# Altium footprint library mastermind.PCBLIB: 1061 footprints (part 60 of 67)
Each footprint in its own frame and in the unit in brackets; x right, y up, seen from the top. Pads: shape width x height; smd on the part's side, far side on the other; paste and mask are expansions set on the pad; w line width, h text height; cw(c..) or ccw(c..) is an arc to the next point about the centre after c.
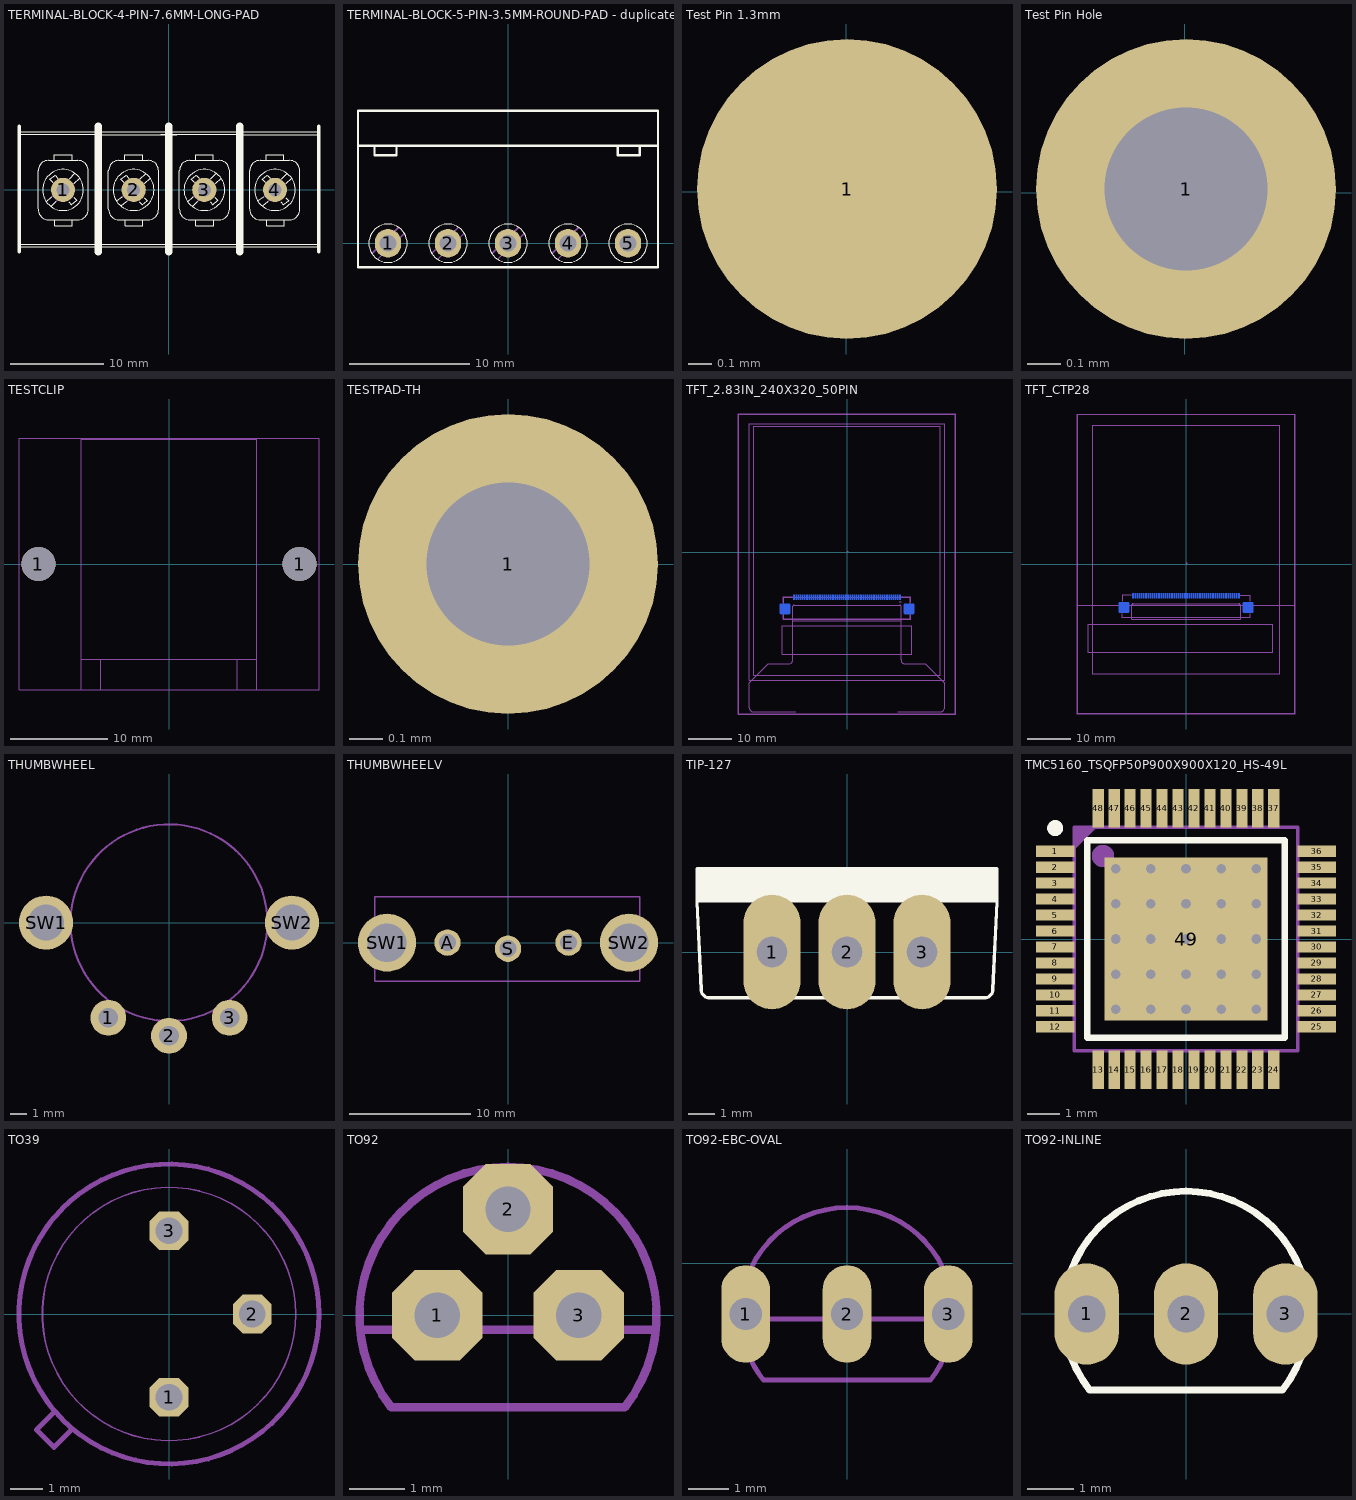
[diagram p59: the footprints below, top view; thin cyan lines are the x and y axes]

## TERMINAL-BLOCK-4-PIN-7.6MM-LONG-PAD [mm]
pads (4):
  round 2.6 / inner round 1.524 / far side round 1.7 hole 1.4: 1(-11.4,0) 2(-3.8,0) 3(3.8,0) 4(11.4,0)
Top Overlay:
  circle w0.102: c3.803,0.002 r2.2
  circle w0.102: c11.397,0.002 r2.2
  circle w0.102: c-3.803,0.001 r2.2
  circle w0.102: c-11.397,0.001 r2.2
  lines w0.102: -16.134,-6.123 -7.702,-6.123 ; -16.109,5.967 -7.676,5.967 ; -16.007,6.272 -7.575,6.272 ; -15.982,-5.844 -7.549,-5.844 0.884,-5.844 ; -14.077,-2.084 ccw(c-12.959,-2.084) -12.959,-3.202 ; -14.077,-2.034 -14.077,2.056 cw(c-12.959,2.056) -12.959,3.173 -9.81,3.173 cw(c-9.81,2.056) -8.692,2.056 -8.692,-2.084 cw(c-9.81,-2.084) -9.81,-3.202 -12.909,-3.202 ; -13.185,-1.249 -12.604,-0.713 ; -12.655,-1.754 -12.121,-1.221 ; -12.489,0.824 -12.807,1.141 -12.25,1.597 -11.967,1.266 ; -12.324,3.173 -12.324,3.808 -11.816,3.808 -10.419,3.808 -10.419,3.173 ; -12.299,-3.202 -12.299,-3.837 -11.791,-3.837 -10.394,-3.837 -10.394,-3.202 ; -10.775,-1.246 -10.492,-1.577 -9.935,-1.121 -10.253,-0.804 ; -10.699,1.218 -10.139,1.8 ; -10.191,0.71 -9.596,1.259 ; -7.625,5.942 0.807,5.942 ; -7.524,6.272 0.909,6.272 ; -7.498,-6.123 0.934,-6.123 ; -6.508,-2.084 ccw(c-5.39,-2.084) -5.39,-3.202 ; -6.508,-2.034 -6.508,2.056 cw(c-5.39,2.056) -5.39,3.173 -2.241,3.173 cw(c-2.241,2.056) -1.123,2.056 -1.123,-2.084 cw(c-2.241,-2.084) -2.241,-3.202 -5.339,-3.202 ; -5.644,-1.17 -5.009,-0.713 ; -5.136,-1.703 -4.527,-1.221 ; -4.846,0.826 -5.163,1.144 -4.607,1.599 -4.323,1.268 ; -4.755,3.173 -4.755,3.808 -3.358,3.808 -2.85,3.808 -2.85,3.173 ; -4.704,-3.202 -4.704,-3.837 -3.307,-3.837 -2.799,-3.837 -2.799,-3.202 ; -3.18,-1.272 -2.897,-1.602 -2.34,-1.147 -2.658,-0.829 ; -3.079,1.218 -2.52,1.751 ; -2.596,0.71 -2.012,1.243 ; -0.934,-6.123 7.498,-6.123 ; -0.909,5.968 7.524,5.968 ; -0.807,6.272 7.625,6.272 ; -0.782,-5.843 7.651,-5.843 16.084,-5.843 ; 1.123,-2.084 ccw(c2.241,-2.084) 2.241,-3.202 ; 1.123,-2.033 1.123,2.056 cw(c2.241,2.056) 2.241,3.174 5.39,3.174 cw(c5.39,2.056) 6.508,2.056 6.508,-2.084 cw(c5.39,-2.084) 5.39,-3.202 2.291,-3.202 ; 2.015,-1.249 2.596,-0.713 ; 2.545,-1.754 3.079,-1.221 ; 2.711,0.824 2.393,1.142 2.95,1.597 3.233,1.266 ; 2.876,3.174 2.876,3.809 3.384,3.809 4.781,3.809 4.781,3.174 ; 2.901,-3.202 2.901,-3.837 3.409,-3.837 4.806,-3.837 4.806,-3.202 ; 4.425,-1.246 4.708,-1.577 5.265,-1.121 4.947,-0.804 ; 4.501,1.218 5.061,1.8 ; 5.009,0.71 5.604,1.259 ; 7.575,5.942 16.007,5.942 ; 7.676,6.272 16.109,6.272 ; 7.702,-6.123 16.134,-6.123 ; 8.692,-2.084 ccw(c9.81,-2.084) 9.81,-3.202 ; 8.692,-2.033 8.692,2.056 cw(c9.81,2.056) 9.81,3.174 12.959,3.174 cw(c12.959,2.056) 14.077,2.056 14.077,-2.084 cw(c12.959,-2.084) 12.959,-3.202 9.861,-3.202 ; 9.556,-1.17 10.191,-0.713 ; 10.064,-1.703 10.673,-1.221 ; 10.354,0.826 10.037,1.144 10.593,1.599 10.877,1.269 ; 10.445,3.174 10.445,3.809 11.842,3.809 12.35,3.809 12.35,3.174 ; 10.496,-3.202 10.496,-3.837 11.893,-3.837 12.401,-3.837 12.401,-3.202 ; 12.02,-1.271 12.303,-1.602 12.86,-1.147 12.542,-0.829 ; 12.121,1.218 12.68,1.751 ; 12.604,0.71 13.188,1.243
  lines w0.4: -16.1,-6.65 -16.1,6.85 ; 16.1,-6.65 16.1,6.85
  lines w0.8: -7.609,-6.65 -7.609,6.85 ; -0.018,-6.65 -0.018,6.85 ; 7.591,-6.65 7.591,6.85
Mechanical 8:
  lines w0.102: -12.603,-0.709 -10.687,1.207 ; -12.108,-1.205 -10.197,0.707 ; -5.009,-0.709 -3.092,1.207 ; -4.513,-1.205 -2.603,0.707 ; 2.597,-0.709 4.513,1.208 ; 3.092,-1.204 5.003,0.707 ; 10.191,-0.709 12.108,1.208 ; 10.687,-1.204 12.597,0.707
3D body "Barrier Termianl.STEP": height 14.8, standoff -2.5, extent -0.78,-6.777 15.98,6.933
3D body "Barrier Termianl.STEP": height 14.8, standoff -2.5, extent -15.98,-6.777 0.78,6.933

## TERMINAL-BLOCK-5-PIN-3.5MM-ROUND-PAD - duplicate [mm]
pads (5):
  oval 2.2x2.4 / inner round 1.524 / far side oval 2.2x2.4 hole 1.4: 1(-10,0) 2(-5,0) 3(0,0) 4(5,0) 5(10,0)
Top Overlay:
  circle w0.102: c-10,0 r1.6
  circle w0.102: c5,0 r1.6
  circle w0.102: c0,0 r1.6
  circle w0.102: c-5,0 r1.6
  circle w0.102: c10,0 r1.6
  lines w0.203: -12.482,8.117 12.446,8.106 ; -11.105,8.116 -11.125,8.116 -11.125,7.341 -9.29,7.341 -9.29,8.115 ; 9.153,8.107 9.153,7.332 10.988,7.332 10.988,8.106 ; -12.5,-1.984 -12.5,11.049 12.5,11.049 12.5,-2.01 -12.5,-1.984
Mechanical 8:
  lines w0.127: -11.306,-0.837 -9.096,1.335 ; -10.824,-1.319 -8.614,0.827 ; -6.361,-0.862 -4.151,1.31 ; -5.878,-1.345 -3.668,0.802 ; -1.306,-0.837 0.904,1.335 ; -0.824,-1.319 1.386,0.827 ; 3.694,-0.837 5.904,1.335 ; 4.176,-1.319 6.386,0.827

## Test Pin 1.3mm [mm]
pads (1):
  round 1.3 smd paste+0 mask+0: 1(0.004,0.011)

## Test Pin Hole [mil]
pads (1):
  round 35 hole 19.02: 1(0.14,0.45)

## TESTCLIP [mm]
pads (2):
  round 3.5 hole 3.5: 1(-13.4,0) 1(13.4,0)
Mechanical 2:
  lines w0.127: -9,-12.9 -9,-9.8 ; -9,-12.9 -7,-12.9 ; -9,-12.9 -15.4,-12.9 -15.4,12.9 15.4,12.9 15.4,-12.9 9,-12.9 ; -9,-9.8 -7,-9.8 ; -9,-9.8 -9,12.8 9,12.8 9,-9.8 ; -7,-12.9 7,-12.9 ; -7,-12.9 -7,-9.8 ; -7,-12.9 7,-12.9 ; -7,-9.8 7,-9.8 ; 7,-12.9 7,-9.8 ; 7,-12.9 9,-12.9 ; 7,-9.8 9,-9.8 ; 9,-12.9 9,-9.8

## TESTPAD-TH [mil]
pads (1):
  round 35 hole 19.02: 1(0,0)

## TFT_2.83IN_240X320_50PIN [mm]
pads (52):
  rect 0.275x1.2 smd far side mask-0.6: 1(12.25,-10.39) 2(11.75,-10.39) 3(11.25,-10.39) 4(10.75,-10.39) 5(10.25,-10.39) 6(9.75,-10.39) 7(9.25,-10.39) 8(8.75,-10.39) 9(8.25,-10.39) 10(7.75,-10.39) 11(7.25,-10.39) 12(6.75,-10.39) 13(6.25,-10.39) 14(5.75,-10.39) 15(5.25,-10.39) 16(4.75,-10.39) 17(4.25,-10.39) 18(3.75,-10.39) 19(3.25,-10.39) 20(2.75,-10.39) 21(2.25,-10.39) 22(1.75,-10.39) 23(1.25,-10.39) 24(0.75,-10.39) 25(0.25,-10.39) 26(-0.25,-10.39) 27(-0.75,-10.39) 28(-1.25,-10.39) 29(-1.75,-10.39) 30(-2.25,-10.39) 31(-2.75,-10.39) 32(-3.25,-10.39) 33(-3.75,-10.39) 34(-4.25,-10.39) 35(-4.75,-10.39) 36(-5.25,-10.39) 37(-5.75,-10.39) 38(-6.25,-10.39) 39(-6.75,-10.39) 40(-7.25,-10.39) 41(-7.75,-10.39) 42(-8.25,-10.39) 43(-8.75,-10.39) 44(-9.25,-10.39) 45(-9.75,-10.39) 46(-10.25,-10.39) 47(-10.75,-10.39) 48(-11.25,-10.39) 49(-11.75,-10.39) 50(-12.25,-10.39)
  rrect25% 2.4x2.4 smd far side: PAD1(14.35,-13.09) PAD2(-14.35,-13.09)
Bottom Solder:
  drawing of 50 lines, arcs and shapes, not listed
Mechanical 2:
  lines w0.127: -25.1,-37.4 -25.1,32 25.1,32 25.1,-37.4 -25.1,-37.4
Mechanical 3:
  lines w0.127: -14.8,-14.59 -14.8,-15.49 14.8,-15.49 14.8,-14.59 ; -14.8,-11.59 -14.8,-10.29 -12.7,-10.29 ; 12.6,-10.29 14.8,-10.29 14.8,-11.59
Mechanical 8:
  lines w0.127: -11.8,-36.9 -12.1,-36.9 -21.7,-36.9 cw(c-21.7,-36) -22.6,-36 -22.6,-30.2 -18.2,-25.8 -13.5,-25.8 ccw(c-13.5,-24.8) -12.5,-24.8 -12.5,-15.8 ; 11.7,-36.9 21.6,-36.9 ccw(c21.6,-35.9) 22.6,-35.9 22.6,-30.3 18.1,-25.8 17.9,-25.8 13.4,-25.8 cw(c13.4,-24.9) 12.5,-24.9 12.5,-15.8 ; -12.5,-15.8 12.5,-15.8 ; -12.5,-15.8 -12.5,-12.5 cw(c-12.2,-12.5) -12.2,-12.2 12.2,-12.2 cw(c12.2,-12.5) 12.5,-12.5 12.5,-15.8 ; -25,-37.3 -25,31.9 25,31.9 25,-37.3 -25,-37.3 ; -22.6,-29.55 -22.6,29.8 22.6,29.8 22.6,-29.55 -22.6,-29.55 ; -21.6,-28.38 -21.6,29.22 21.6,29.22 21.6,-28.38 -21.6,-28.38 ; -15,-23.54 -15,-17 15,-17 15,-23.54 -15,-23.54
Mechanical 9:
  lines w0.127: 12.3,-11.39 12.4,-11.49 ; 12.4,-11.49 12.5,-11.49 12.3,-11.29 12.1,-11.49 12.4,-11.49 ; -14.65,-15.39 14.65,-15.39 14.65,-10.39 -14.65,-10.39 -14.65,-15.39
Mechanical 36:
  region: 0,0 0.254,0 0.254,0.254 0,0.254

## TFT_CTP28 [mm]
pads (52):
  rect 0.275x1.2 smd far side mask-0.6: 1(12.25,-7.36) 2(11.75,-7.36) 3(11.25,-7.36) 4(10.75,-7.36) 5(10.25,-7.36) 6(9.75,-7.36) 7(9.25,-7.36) 8(8.75,-7.36) 9(8.25,-7.36) 10(7.75,-7.36) 11(7.25,-7.36) 12(6.75,-7.36) 13(6.25,-7.36) 14(5.75,-7.36) 15(5.25,-7.36) 16(4.75,-7.36) 17(4.25,-7.36) 18(3.75,-7.36) 19(3.25,-7.36) 20(2.75,-7.36) 21(2.25,-7.36) 22(1.75,-7.36) 23(1.25,-7.36) 24(0.75,-7.36) 25(0.25,-7.36) 26(-0.25,-7.36) 27(-0.75,-7.36) 28(-1.25,-7.36) 29(-1.75,-7.36) 30(-2.25,-7.36) 31(-2.75,-7.36) 32(-3.25,-7.36) 33(-3.75,-7.36) 34(-4.25,-7.36) 35(-4.75,-7.36) 36(-5.25,-7.36) 37(-5.75,-7.36) 38(-6.25,-7.36) 39(-6.75,-7.36) 40(-7.25,-7.36) 41(-7.75,-7.36) 42(-8.25,-7.36) 43(-8.75,-7.36) 44(-9.25,-7.36) 45(-9.75,-7.36) 46(-10.25,-7.36) 47(-10.75,-7.36) 48(-11.25,-7.36) 49(-11.75,-7.36) 50(-12.25,-7.36)
  rrect25% 2.4x2.4 smd far side: PAD1(14.35,-10.06) PAD2(-14.35,-10.06)
Mechanical 2:
  lines w0.127: -25.1,-34.7 25.1,-34.7 25.1,34.7 -25.1,34.7 -25.1,-34.7
Mechanical 3:
  region: 0,0 0.254,0 0.254,0.254 0,0.254
  lines w0.127: -14.8,-11.56 -14.8,-12.46 14.8,-12.46 14.8,-11.56 ; -14.8,-8.56 -14.8,-7.26 -12.7,-7.26 ; 12.6,-7.26 14.8,-7.26 14.8,-8.56
Mechanical 8:
  lines w0.127: -25,-9.6 -25,-34.6 25,-34.6 25,-9.6 ; -25,-9.6 -25,34.6 25,34.6 25,-9.6 ; -25,-9.6 25,-9.6 ; -22.62,-20.51 20,-20.51 20,-13.97 -22.62,-13.97 -22.62,-20.51 ; -21.6,-25.5 21.6,-25.5 21.6,32.1 -21.6,32.1 -21.6,-25.5 ; -12.5,-12.77 -12.5,-9.47 cw(c-12.2,-9.47) -12.2,-9.17 12.2,-9.17 cw(c12.2,-9.47) 12.5,-9.47 12.5,-12.77 -12.5,-12.77

## THUMBWHEEL [mil]
pads (5):
  round 86 hole 47.24: 1(-145.67,-228.35) 2(0,-271.65) 3(145.67,-228.35)
  round 129.91 hole 86.61: SW1(-295.28,0) SW2(295.28,0)
Mechanical 2:
  circle w5: c0,0 r236.22

## THUMBWHEELV [mil]
pads (5):
  round 86 hole 55.12: A(-196.85,0) E(196.85,0) S(0,-19.69)
  round 188.97 hole 125.98: SW1(-393.7,0) SW2(393.7,0)
Mechanical 2:
  lines w5: -433.07,-125.98 429.13,-125.98 429.13,149.61 -433.07,149.61 -433.07,-125.98

## TIP-127 [mil]
pads (3):
  oval 86x172 hole 45.28 slot 45.48 at 90 deg paste-99999 mask+4: 1(-112.5,0) 2(0,0) 3(112.5,0)
Top Overlay:
  region: -225,75 225,75 225,125 -225,125
  lines w5: -225,75 -225,125 225,125 225,75 218.75,-56.25 cw(c206.25,-56.25) 206.25,-68.75 -206.25,-68.75 cw(c-206.25,-56.25) -218.75,-56.25 -225,75

## TMC5160_TSQFP50P900X900X120_HS-49L [mm] "TSQFP, 48-Leads, Body 7,00x7,00mm, Pitch 0,50mm, Thermal Pad 5,10x5,10mm, IPC High Density"
height 1.2
pads (49):
  rect 1.2x0.35 smd mask+0.102: 1(-4.1,2.75) 2(-4.1,2.25) 3(-4.1,1.75) 4(-4.1,1.25) 5(-4.1,0.75) 6(-4.1,0.25) 7(-4.1,-0.25) 8(-4.1,-0.75) 9(-4.1,-1.25) 10(-4.1,-1.75) 11(-4.1,-2.25) 12(-4.1,-2.75) 25(4.1,-2.75) 26(4.1,-2.25) 27(4.1,-1.75) 28(4.1,-1.25) 29(4.1,-0.75) 30(4.1,-0.25) 31(4.1,0.25) 32(4.1,0.75) 33(4.1,1.25) 34(4.1,1.75) 35(4.1,2.25) 36(4.1,2.75)
  rect 0.35x1.2 smd mask+0.102: 13(-2.75,-4.1) 14(-2.25,-4.1) 15(-1.75,-4.1) 16(-1.25,-4.1) 17(-0.75,-4.1) 18(-0.25,-4.1) 19(0.25,-4.1) 20(0.75,-4.1) 21(1.25,-4.1) 22(1.75,-4.1) 23(2.25,-4.1) 24(2.75,-4.1) 37(2.75,4.1) 38(2.25,4.1) 39(1.75,4.1) 40(1.25,4.1) 41(0.75,4.1) 42(0.25,4.1) 43(-0.25,4.1) 44(-0.75,4.1) 45(-1.25,4.1) 46(-1.75,4.1) 47(-2.25,4.1) 48(-2.75,4.1)
  rect 5.1x5.1 smd: 49(0,0)
via 2.2,-2.2 diameter 0.5 hole 0.3
via 1.1,-2.2 diameter 0.5 hole 0.3
via 0,-2.2 diameter 0.5 hole 0.3
via -1.1,-2.2 diameter 0.5 hole 0.3
via -2.2,-2.2 diameter 0.5 hole 0.3
via 2.2,-1.1 diameter 0.5 hole 0.3
via 1.1,-1.1 diameter 0.5 hole 0.3
via 0,-1.1 diameter 0.5 hole 0.3
via -1.1,-1.1 diameter 0.5 hole 0.3
via -2.2,-1.1 diameter 0.5 hole 0.3
via 2.2,0 diameter 0.5 hole 0.3
via 1.1,0 diameter 0.5 hole 0.3
via 0,0 diameter 0.5 hole 0.3
via -1.1,0 diameter 0.5 hole 0.3
via -2.2,0 diameter 0.5 hole 0.3
via 2.2,1.1 diameter 0.5 hole 0.3
via 1.1,1.1 diameter 0.5 hole 0.3
via 0,1.1 diameter 0.5 hole 0.3
via -1.1,1.1 diameter 0.5 hole 0.3
via -2.2,1.1 diameter 0.5 hole 0.3
via 2.2,2.2 diameter 0.5 hole 0.3
via 1.1,2.2 diameter 0.5 hole 0.3
via 0,2.2 diameter 0.5 hole 0.3
via -1.1,2.2 diameter 0.5 hole 0.3
via -2.2,2.2 diameter 0.5 hole 0.3
Top Overlay:
  circle w0.25: c-4.1,3.475 r0.125
  lines w0.2: -3.1,-3.1 3.1,-3.1 3.1,3.1 -3.1,3.1 -3.1,-3.1
Bottom Solder:
  region: -2.54,2.54 -2.54,-2.54 2.54,-2.54 2.54,2.54
Mechanical 29:
  circle w0.5: c-2.6,2.6 r0.1
  region: -2.794,3.5 -3.5,2.794 -3.5,3.5
  lines w0.1: -3.5,-3.5 -3.5,3.5 3.5,3.5 3.5,-3.5 -3.5,-3.5
  text ".Designator" at -2.413,-0.381 h1.27
3D body "TSQFP50P900X900X120_HS-49L.step": height 1.2, standoff 0, extent -4.5,-4.5 4.5,4.5

## TO39 [mil]
pads (3):
  oct 46.48x46.48 hole 32: 1(0,-100) 2(100,0) 3(0,100)
Mechanical 2:
  circle w6: c0,0 r180
  circle w2: c0,0 r152
  lines w6: -138,-118 -159,-139 -138,-160 -117,-139

## TO92 [mil]
pads (3):
  oct 63.9x63.9 hole 32: 1(-50,0) 2(0,75) 3(50,0)
Mechanical 2:
  lines w6: -104.53,-10 -88.74,-10 ; -30.98,100.33 ccw(c-0.02,0) -82.48,-65 82.48,-65 ccw(c0.02,0) 30.98,100.33 ; -11.26,-10 11.26,-10 ; 88.74,-10 104.53,-10
Mechanical 8:
  lines w6: -88.74,-10 -11.26,-10 ; -30.96,100.33 cw(c0,0) 30.96,100.33 ; 11.26,-10 88.74,-10

## TO92-EBC-OVAL [mil]
pads (3):
  oval 48x96 hole 32: 1(-100,-50) 2(0,-50) 3(100,-50)
Mechanical 2:
  lines w5: -95.02,-94.72 ccw(c-0.02,-49.99) -82.48,-115 82.48,-115 ccw(c0.01,-50) 95.46,-93.77 ; -95,-5.28 cw(c0,-50) 95,-5.28 ; -55.28,-55 -44.72,-55 ; 44.72,-55 55.28,-55
Mechanical 8:
  lines w5: -104.88,-55 -55.28,-55 ; -95,-94.72 cw(c0,-50) -95,-5.28 ; -44.72,-55 44.72,-55 ; 55.28,-55 104.88,-55 ; 95,-94.72 ccw(c0,-50) 95,-5.28

## TO92-INLINE [mm]
pads (3):
  oval 1.4x2.2 hole 0.813: 1(-2.159,0) 2(0,0) 3(2.159,0)
Top Overlay:
  lines w0.152: -2.655,-0.254 -2.254,-0.254 ; -2.095,-1.651 2.095,-1.651 ccw(c0.001,0) 0.787,2.548 ; -2.094,-1.651 cw(c0,0) -0.786,2.548 cw(c0,0) 0.786,2.548 ; 2.254,-0.254 2.655,-0.254